# Altium footprint library Horizont_11_12_2017.PcbLib: 257 footprints (part 4 of 17)
Each footprint in its own frame and in the unit in brackets; x right, y up, seen from the top. Pads: shape width x height; smd on the part's side, far side on the other; paste and mask are expansions set on the pad; w line width, h text height; cw(c..) or ccw(c..) is an arc to the next point about the centre after c.
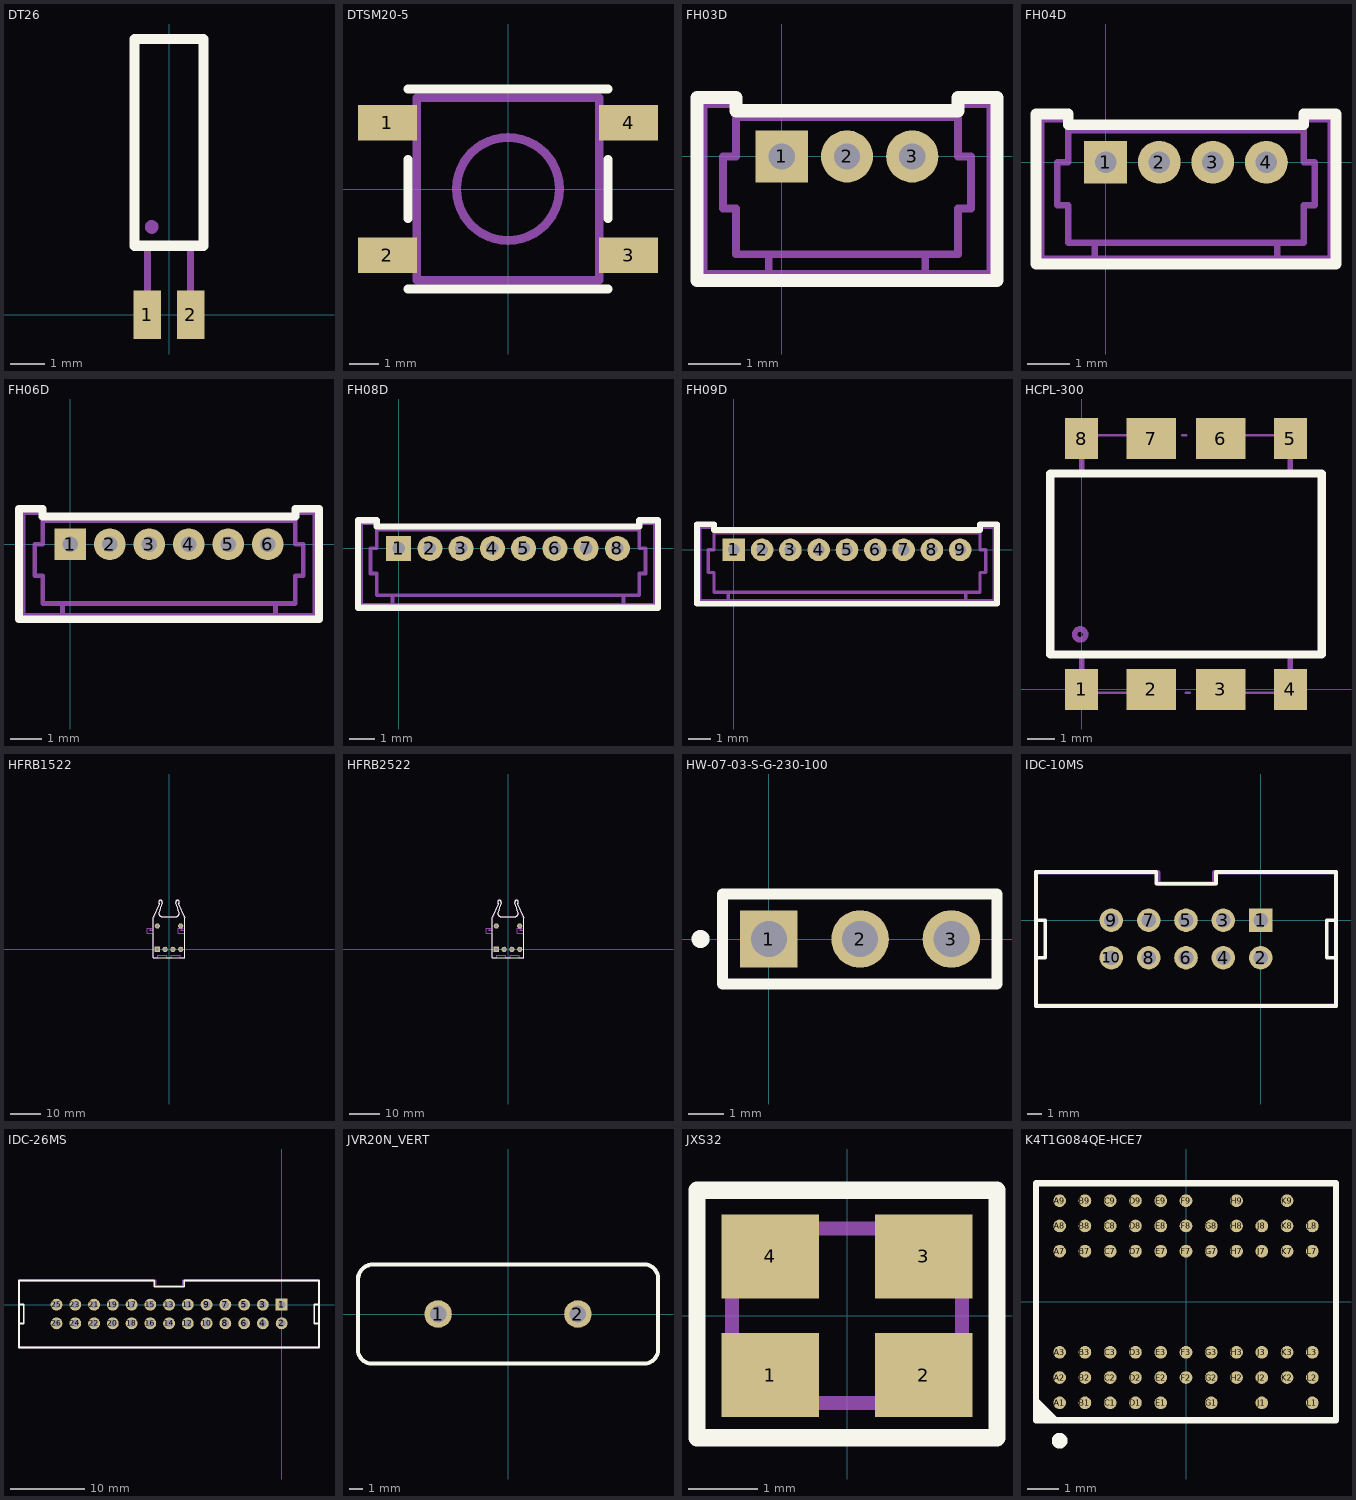
[diagram p3: the footprints below, top view; thin cyan lines are the x and y axes]

## DT26 [mm]
height 2
pads (2):
  rect 0.8x1.4 smd: 1(-0.625,0) 2(0.625,0)
Top Overlay:
  lines w0.3: -1,2 -1,8 1,8 1,2 -1,2
Mechanical 1:
  circle w0.2: c-0.5,2.55 r0.1
  lines w0.2: -0.625,-0.5 -0.625,2 ; 0.625,-0.5 0.625,2 ; -1,2 1,2 1,8 -1,8 -1,2
  text ".Designator" at 0.39,4 h1.5
3D body "pk-206.stp": height 2, standoff 0, extent -1,-0.5 0.992,8

## DTSM20-5 [mm]
height 5
pads (4):
  rect 2x1.2 smd: 1(-4.1,2.25) 2(-4.1,-2.25) 3(4.1,-2.25) 4(4.1,2.25)
Top Overlay:
  lines w0.3: -3.4,-3.4 3.4,-3.4 ; -3.4,-1 -3.4,1 ; -3.4,3.4 3.4,3.4 ; 3.4,-1 3.4,1
Mechanical 1:
  circle w0.3: c0,0 r1.75
  lines w0.3: -3.1,-2.6 -4.5,-2.6 -4.5,-1.9 -3.1,-1.9 ; -3.1,1.9 -4.5,1.9 -4.5,2.6 -3.1,2.6 ; 3.1,-2.6 4.5,-2.6 4.5,-1.9 3.1,-1.9 ; 3.1,1.9 4.5,1.9 4.5,2.6 3.1,2.6 ; -3.1,-3.1 -3.1,3.1 3.1,3.1 3.1,-3.1 -3.1,-3.1
  text ".Designator" at -2.24,3.83 h1.5
3D body "DTSM20-5.STEP": height 5.1, standoff 0, extent -4.5,-3.1 4.5,3.1

## FH03D [mm]
height 4.8
pads (3):
  rect 1x1 hole 0.5: 1(0,0)
  round 1 hole 0.5: 2(1.25,0) 3(2.5,0)
Top Overlay:
  lines w0.25: -1.625,-2.375 -1.625,1.125 -0.875,1.125 -0.875,0.875 3.375,0.875 3.375,1.125 4.125,1.125 4.125,-2.125 4.125,-2.375 -1.625,-2.375
Mechanical 1:
  lines w0.15: -0.25,-2.25 -0.25,-1.875 ; 2.625,-1.875 3.375,-1.875 ; 2.75,-2.25 2.75,-1.875 ; -0.875,0.75 -0.875,1 -1.5,1 -1.5,-2.25 4,-2.25 4,1 3.375,1 3.375,0.75 ; -0.875,0.75 -0.875,0 -1.125,0 -1.125,-1 -0.875,-1 -0.875,-1.875 3.375,-1.875 ; -0.875,0.75 3.375,0.75 ; 3.375,-1.875 3.375,-1 3.625,-1 3.625,0 3.375,0 3.375,0.75
  text "3" at 2.482,-0.482 h1.5
  text "1" at -0.268,-0.482 h1.5
  text ".Comment" at -0.3,-3.525 h1.5
  text ".Designator" at 0.15,-1.325 h1.5
3D body "FH03D.STEP": height 4.75, standoff -2.4, extent -1.5,-2.55 4,1.15

## FH04D [mm]
height 4.8
pads (4):
  rect 1x1 hole 0.5: 1(0,0)
  round 1 hole 0.5: 2(1.25,0) 3(2.5,0) 4(3.75,0)
Top Overlay:
  lines w0.25: -1.625,-2.375 -1.625,1.125 -0.875,1.125 -0.875,0.875 4.625,0.875 4.625,1.125 5.375,1.125 5.375,-2.125 5.375,-2.375 -1.625,-2.375
Mechanical 1:
  lines w0.15: -0.25,-2.25 -0.25,-1.875 ; 3.875,-1.875 4.625,-1.875 ; 4,-2.25 4,-1.875 ; -0.875,0.75 -0.875,1 -1.5,1 -1.5,-2.25 5.25,-2.25 5.25,1 4.625,1 4.625,0.75 ; -0.875,0.75 -0.875,0 -1.125,0 -1.125,-1 -0.875,-1 -0.875,-1.875 4.625,-1.875 ; -0.875,0.75 4.625,0.75 ; 4.625,-1.875 4.625,-1 4.875,-1 4.875,0 4.625,0 4.625,0.75
  text "4" at 3.732,-0.482 h1.5
  text "1" at -0.268,-0.482 h1.5
  text ".Comment" at -0.3,-3.525 h1.5
  text ".Designator" at 0.15,-1.325 h1.5
3D body "FH04D.STEP": height 4.75, standoff -2.4, extent -1.5,-2.55 5.25,1.15

## FH06D [mm]
height 4.8
pads (6):
  rect 1x1 hole 0.5: 1(0,0)
  round 1 hole 0.5: 2(1.25,0) 3(2.5,0) 4(3.75,0) 5(5,0) 6(6.25,0)
Top Overlay:
  lines w0.25: -1.625,-2.375 -1.625,1.125 -0.875,1.125 -0.875,0.875 7.125,0.875 7.125,1.125 7.875,1.125 7.875,-2.125 7.875,-2.375 -1.625,-2.375
Mechanical 1:
  lines w0.15: -0.25,-2.25 -0.25,-1.875 ; 6.5,-2.25 6.5,-1.875 ; -0.875,0.75 -0.875,1 -1.5,1 -1.5,-2.25 7.75,-2.25 7.75,1 7.125,1 7.125,0.75 ; -0.875,0.75 -0.875,0 -1.125,0 -1.125,-1 -0.875,-1 -0.875,-1.875 6.375,-1.875 7.125,-1.875 7.125,-1 7.375,-1 7.375,0 7.125,0 7.125,0.75 ; -0.875,0.75 7.125,0.75
  text "6" at 6.232,-0.482 h1.5
  text "1" at -0.268,-0.482 h1.5
  text ".Comment" at 0.925,-3.625 h1.5
  text ".Designator" at 1.525,-0.925 h1.5
3D body "FH06D.STEP": height 4.75, standoff -2.4, extent -1.5,-2.55 7.75,1.15

## FH08D [mm]
height 4.8
pads (8):
  rect 1x1 hole 0.5: 1(0,0)
  round 1 hole 0.5: 2(1.25,0) 3(2.5,0) 4(3.75,0) 5(5,0) 6(6.25,0) 7(7.5,0) 8(8.75,0)
Top Overlay:
  lines w0.25: -1.625,-2.375 10.375,-2.375 10.375,-2.125 10.375,1.125 9.625,1.125 9.625,0.875 -0.875,0.875 -0.875,1.125 -1.625,1.125 -1.625,-2.375
Mechanical 1:
  lines w0.15: -0.25,-2.25 -0.25,-1.875 ; 9,-2.25 9,-1.875 ; -0.875,0.75 9.625,0.75 ; -0.875,0.75 -0.875,0 -1.125,0 -1.125,-1 -0.875,-1 -0.875,-1.875 8.875,-1.875 9.625,-1.875 9.625,-1 9.875,-1 9.875,0 9.625,0 9.625,0.75 ; -0.875,0.75 -0.875,1 -1.5,1 -1.5,-2.25 10.25,-2.25 10.25,1 9.625,1 9.625,0.75
  text ".Designator" at 2.5,-1.25 h1.5
  text ".Comment" at 0.925,-3.625 h1.5
  text "1" at -0.268,-0.482 h1.5
  text "8" at 8.732,-0.482 h1.5
3D body "FH08D.STEP": height 4.75, standoff -2.4, extent -1.5,-2.55 10.25,1.15

## FH09D [mm]
height 4.8
pads (9):
  rect 1x1 hole 0.5: 1(0,0)
  round 1 hole 0.5: 2(1.25,0) 3(2.5,0) 4(3.75,0) 5(5,0) 6(6.25,0) 7(7.5,0) 8(8.75,0) 9(10,0)
Top Overlay:
  lines w0.25: -1.625,-2.375 11.625,-2.375 11.625,-2.125 11.625,1.125 10.875,1.125 10.875,0.875 -0.875,0.875 -0.875,1.125 -1.625,1.125 -1.625,-2.375
Mechanical 1:
  lines w0.15: -0.25,-2.25 -0.25,-1.875 ; 10.25,-2.25 10.25,-1.875 ; -0.875,0.75 10.875,0.75 ; -0.875,0.75 -0.875,0 -1.125,0 -1.125,-1 -0.875,-1 -0.875,-1.875 10.125,-1.875 10.875,-1.875 10.875,-1 11.125,-1 11.125,0 10.875,0 10.875,0.75 ; -0.875,0.75 -0.875,1 -1.5,1 -1.5,-2.25 11.5,-2.25 11.5,1 10.875,1 10.875,0.75
  text ".Designator" at 2.5,-1.25 h1.5
  text ".Comment" at 0.925,-3.625 h1.5
  text "1" at -0.268,-0.482 h1.5
  text "9" at 9.982,-0.482 h1.5
3D body "FH09D.STEP": height 4.75, standoff -2.4, extent -1.5,-2.55 11.5,1.15

## HCPL-300 [mm]
height 5
pads (8):
  rect 1.2x1.5 smd: 1(0,0) 4(7.62,0) 5(7.62,9.144) 8(0,9.144)
  rect 1.8x1.5 smd: 2(2.54,0) 3(5.08,0) 6(5.08,9.144) 7(2.54,9.144)
Top Overlay:
  lines w0.3: -1.14,1.272 -1.14,7.872 8.76,7.872 8.76,1.272 -1.14,1.272
Mechanical 1:
  circle w0.2: c-0.05,2.004 r0.2
  lines w0.1: 0,-0.127 3.175,-0.127 ; 0,9.271 3.175,9.271 ; 3.683,9.271 3.81,9.271 ; 3.81,-0.127 3.937,-0.127 ; 4.445,-0.127 7.62,-0.127 ; 4.445,9.271 7.62,9.271
  lines w0.2: 0,-0.127 0,1.27 ; 0,7.874 0,9.271 ; 7.62,-0.127 7.62,1.27 ; 7.62,7.874 7.62,9.271 ; -1.14,1.272 -1.14,7.872 8.76,7.872 8.76,1.272 -1.14,1.272
  text "8" at -0.27,6.555 h1.5
  text ".Comment" at 1.51,3.61 h1.5
  text ".Designator" at 3.1,5.31 h1.5
3D body "HCPL7800A-300.stp": height 4.96, standoff 0, extent -1.14,-0.38 8.76,9.52

## HFRB1522 [mm]
height 7.6
pads (6):
  rect 1.7x1.7 hole 1.1: 1(-3.81,0)
  round 1.7 hole 1.1: 2(-1.27,0) 3(1.27,0) 4(3.81,0) 5(3.81,7.62) 6(-3.81,7.62)
Top Overlay:
  circle w0.25: c-3.789,-0.002 r0.1
  lines w0.3: 3.1,14.8 5.1,10.3 5.1,9.8 5.1,-2.8 -5.1,-2.8 -5.1,10.3 -3.1,14.88 cw(c-2.8,15.4) -2.241,15.182 ccw(c22.449,5.555) -3.271,11.941 ccw(c-2.3,11.7) -2.3,10.7 2.3,10.7 ccw(c2.3,11.7) 3.271,11.941 ccw(c-22.449,5.555) 2.241,15.182 cw(c2.8,15.4) 3.1,14.88
Mechanical 1:
  lines w0.2: -7.1,5.2 -7.1,6.9 -5.6,6.9 -6.3,6.2 -5.1,6.2 -5.1,9.9 cw(c21.297,2.191) -3.1,14.88 cw(c-2.8,15.4) -2.241,15.182 ccw(c22.449,5.555) -3.271,11.941 ccw(c-2.3,11.7) -2.3,10.7 2.3,10.7 ccw(c2.3,11.7) 3.271,11.941 ccw(c-22.449,5.555) 2.241,15.182 cw(c2.8,15.4) 3.1,14.88 cw(c-21.297,2.191) 5.1,9.9 5.1,6.2 3.9,6.2 4.6,6.9 3.1,6.9 3.1,5.2 5.1,5.2 5.1,-2.8 3.6,-2.8 3.6,-2 0.75,-2 0.75,-2.8 -0.75,-2.8 -0.75,-2 -3.6,-2 -3.6,-2.8 -5.1,-2.8 -5.1,5.2 -7.1,5.2
  text ".Designator" at -3.082,3.588 h1.5
  text "2" at -1.482,-0.382 h1.5
  text "4" at 3.618,-0.382 h1.5
  text "1" at -3.982,-0.382 h1.5
  text "3" at 0.918,-0.382 h1.5
  text "6" at -4.082,8.388 h1.5
  text "5" at 3.618,8.388 h1.5
3D body "HFRB1522.stp": height 7.6, standoff -3.16, extent -7.1,-2.8 5.1,16

## HFRB2522 [mm]
height 7.6
pads (6):
  rect 1.7x1.7 hole 1.1: 1(-3.81,0)
  round 1.7 hole 1.1: 2(-1.27,0) 3(1.27,0) 4(3.81,0) 5(3.81,7.62) 6(-3.81,7.62)
Top Overlay:
  circle w0.25: c-3.789,-0.002 r0.1
  lines w0.3: 3.1,14.8 5.1,10.3 5.1,9.8 5.1,-2.8 -5.1,-2.8 -5.1,10.3 -3.1,14.88 cw(c-2.8,15.4) -2.241,15.182 ccw(c22.449,5.555) -3.271,11.941 ccw(c-2.3,11.7) -2.3,10.7 2.3,10.7 ccw(c2.3,11.7) 3.271,11.941 ccw(c-22.449,5.555) 2.241,15.182 cw(c2.8,15.4) 3.1,14.88
Mechanical 1:
  lines w0.2: -7.1,5.2 -7.1,6.9 -5.6,6.9 -6.3,6.2 -5.1,6.2 -5.1,9.9 cw(c21.297,2.191) -3.1,14.88 cw(c-2.8,15.4) -2.241,15.182 ccw(c22.449,5.555) -3.271,11.941 ccw(c-2.3,11.7) -2.3,10.7 2.3,10.7 ccw(c2.3,11.7) 3.271,11.941 ccw(c-22.449,5.555) 2.241,15.182 cw(c2.8,15.4) 3.1,14.88 cw(c-21.297,2.191) 5.1,9.9 5.1,6.2 3.9,6.2 4.6,6.9 3.1,6.9 3.1,5.2 5.1,5.2 5.1,-2.8 3.6,-2.8 3.6,-2 0.75,-2 0.75,-2.8 -0.75,-2.8 -0.75,-2 -3.6,-2 -3.6,-2.8 -5.1,-2.8 -5.1,5.2 -7.1,5.2
  text ".Designator" at -3.082,3.588 h1.5
  text "2" at -1.482,-0.382 h1.5
  text "4" at 3.618,-0.382 h1.5
  text "1" at -3.982,-0.382 h1.5
  text "3" at 0.918,-0.382 h1.5
  text "6" at -4.082,8.388 h1.5
  text "5" at 3.618,8.388 h1.5
3D body "HFRB1522.stp": height 7.6, standoff -3.16, extent -7.1,-2.8 5.1,16

## HW-07-03-S-G-230-100 [mm]
height 8.38
pads (3):
  rect 1.6x1.6 hole 1: 1(0,0)
  round 1.6 hole 1: 2(2.54,0) 3(5.08,0)
Top Overlay:
  circle w0.3: c-1.9,0 r0.1
  lines w0.3: -1.29,-1.25 6.35,-1.25 6.35,1.25 -1.29,1.25 -1.29,-1.25
Mechanical 1:
  lines w0.2: -1.29,-1.25 6.35,-1.25 6.35,1.25 -1.29,1.25 -1.29,-1.25
  text ".Designator" at 1.397,1.905 h1.5
  text "3" at 4.826,-0.381 h1.5
  text "1" at -0.254,-0.508 h1.5
3D body "HW-07-03-S-G-230-100.stp": height 8.38, standoff -2.54, extent -1.27,-1.27 6.35,1.27

## IDC-10MS [mm]
height 9.1
pads (10):
  rect 1.6x1.6 hole 1: 1(0,0)
  round 1.6 hole 1: 2(0,-2.54) 3(-2.54,0) 4(-2.54,-2.54) 5(-5.08,0) 6(-5.08,-2.54) 7(-7.62,0) 8(-7.62,-2.54) 9(-10.16,0) 10(-10.16,-2.54)
Top Overlay:
  lines w0.25: -7.102,3.22 -7.102,2.48 -3.038,2.48 -3.038,3.253 ; -7.102,3.28 -15.28,3.28 -15.28,-5.82 5.12,-5.82 5.12,3.28 -3.038,3.28
  lines w0.254: -15.28,-2.54 -14.645,-2.54 -14.645,0 -15.28,0 ; 5.12,-2.54 4.485,-2.54 4.485,0 5.12,0
Mechanical 1:
  lines w0.3: -3.165,3.253 -3.165,2.48 -6.975,2.48 -6.975,3.28 -15.28,3.28 -15.28,-5.82 5.12,-5.82 5.12,3.28 -3.165,3.28
  text "10" at -12.619,-2.947 h1.5
  text "2" at 1.477,-2.897 h1.5
  text "9" at -12.3,-0.42 h1.5
  text ".Designator" at -7.03,-1.42 h1.5
  text "1" at 1.477,-0.357 h1.5
3D body "BH-10.STEP": height 9.1, standoff -3, extent -15.33,-6.02 5.17,3.28

## IDC-26MS [mm]
height 9.1
pads (26):
  rect 1.6x1.6 hole 1: 1(0,0)
  round 1.6 hole 1: 2(0,-2.54) 3(-2.54,0) 4(-2.54,-2.54) 5(-5.08,0) 6(-5.08,-2.54) 7(-7.62,0) 8(-7.62,-2.54) 9(-10.16,0) 10(-10.16,-2.54) 11(-12.7,0) 12(-12.7,-2.54) 13(-15.24,0) 14(-15.24,-2.54) 15(-17.78,0) 16(-17.78,-2.54) 17(-20.32,0) 18(-20.32,-2.54) 19(-22.86,0) 20(-22.86,-2.54) 21(-25.4,0) 22(-25.4,-2.54) 23(-27.94,0) 24(-27.94,-2.54) 25(-30.48,0) 26(-30.48,-2.54)
Top Overlay:
  lines w0.25: -35.56,-5.82 5.06,-5.82 5.06,3.28 -13.188,3.28 -13.188,2.413 -17.252,2.413 -17.252,3.28 -35.56,3.28 -35.56,-5.82
  lines w0.254: -35.56,-2.54 -34.925,-2.54 -34.925,0 -35.56,0 ; 5.06,-2.54 4.425,-2.54 4.425,0 5.06,0
Mechanical 1:
  lines w0.3: -35.56,-5.82 5.06,-5.82 5.06,3.28 -13.315,3.28 -13.315,2.54 -17.125,2.54 -17.125,3.28 -35.56,3.28 -35.56,-5.82
  text ".Designator" at -17.907,-1.397 h1.5
  text "1" at 1.477,-0.357 h1.5
  text "25" at -33.209,-0.357 h1.5
  text "2" at 1.477,-2.897 h1.5
  text "26" at -33.209,-2.897 h1.5
3D body "BH-26.STEP": height 9.1, standoff -3, extent -35.65,-6.02 5.17,3.28

## JVR20N_VERT [mm]
height 28
pads (2):
  round 2 hole 1.2: 1(-5.08,0) 2(5.08,0)
Top Overlay:
  lines w0.3: -10,-3.6 10,-3.6 ; -9.9,-3.6 cw(c-9.9,-2.6) -10.9,-2.6 -10.9,2.5 cw(c-9.8,2.5) -9.8,3.6 10,3.6 ; 9.9,-3.6 ccw(c9.9,-2.6) 10.9,-2.6 10.9,2.6 ccw(c9.9,2.6) 9.9,3.6
Mechanical 1:
  circle w0.1: c-5.5,-0.05 r0.1
  lines w0.2: -10.9,-2.6 ccw(c-9.9,-2.6) -9.9,-3.6 ; -10.9,-2.5 -10.9,2.5 ; -10.9,2.6 cw(c-9.9,2.6) -9.9,3.6 ; -10.1,-3.6 9.9,-3.6 ccw(c9.9,-2.6) 10.9,-2.6 ; -10,3.6 10,3.6 ; 9.9,3.6 cw(c9.9,2.6) 10.9,2.6 ; 10.9,-2.5 10.9,2.5
  text ".Comment" at -2.5,-1.28 h1.5
  text ".Designator" at -0.91,0.42 h1.5
3D body "JVR-JOYIN.STEP": height 27.3, standoff -5.2, extent -10.9,-3.6 10.9,3.6

## JXS32 [mm]
height 0.7
pads (4):
  rect 1.4x1.2 smd: 1(-1.1,-0.85) 2(1.1,-0.85) 3(1.1,0.85) 4(-1.1,0.85)
Top Overlay:
  lines w0.25: -2.15,-1.75 2.15,-1.75 2.15,1.8 -2.15,1.8 -2.15,-1.75
Mechanical 1:
  lines w0.2: -1.65,-1.25 1.65,-1.25 1.65,1.25 -1.65,1.25 -1.65,-1.25
  text "3" at 0.8,0.1 h1.5
  text "4" at -1.35,0.1 h1.5
  text "2" at 0.75,-0.95 h1.5
  text "1" at -1.2,-1.05 h1.5
  text ".Designator" at -1.2,1.8 h1.5
3D body "JXS32.stp": height 0.7, standoff 0, extent -1.65,-1.3 1.65,1.3

## K4T1G084QE-HCE7 [mm]
height 1.2
pads (60):
  round 0.4 smd: A1(-4,-3.2) A2(-4,-2.4) A3(-4,-1.6) A7(-4,1.6) A8(-4,2.4) A9(-4,3.2) B1(-3.2,-3.2) B2(-3.2,-2.4) B3(-3.2,-1.6) B7(-3.2,1.6) B8(-3.2,2.4) B9(-3.2,3.2) C1(-2.4,-3.2) C2(-2.4,-2.4) C3(-2.4,-1.6) C7(-2.4,1.6) C8(-2.4,2.4) C9(-2.4,3.2) D1(-1.6,-3.2) D2(-1.6,-2.4) D3(-1.6,-1.6) D7(-1.6,1.6) D8(-1.6,2.4) D9(-1.6,3.2) E1(-0.8,-3.2) E2(-0.8,-2.4) E3(-0.8,-1.6) E7(-0.8,1.6) E8(-0.8,2.4) E9(-0.8,3.2) F2(0,-2.4) F3(0,-1.6) F7(0,1.6) F8(0,2.4) F9(0,3.2) G1(0.8,-3.2) G2(0.8,-2.4) G3(0.8,-1.6) G7(0.8,1.6) G8(0.8,2.4) H2(1.6,-2.4) H3(1.6,-1.6) H7(1.6,1.6) H8(1.6,2.4) H9(1.6,3.2) J1(2.4,-3.2) J2(2.4,-2.4) J3(2.4,-1.6) J7(2.4,1.6) J8(2.4,2.4) K2(3.2,-2.4) K3(3.2,-1.6) K7(3.2,1.6) K8(3.2,2.4) K9(3.2,3.2) L1(4,-3.2) L2(4,-2.4) L3(4,-1.6) L7(4,1.6) L8(4,2.4)
Top Overlay:
  circle w0.25: c-4,-4.4 r0.125
  region: -4.75,-3.132 -4.132,-3.75 -4.75,-3.75
  lines w0.2: -4.75,-3.132 -4.132,-3.75 ; -4.75,-3.75 -4.75,3.75 4.75,3.75 4.75,-3.75 -4.75,-3.75
Mechanical 1:
  lines w0.1: -4.75,-3.75 -4.75,3.75 4.75,3.75 4.75,-3.75 -4.75,-3.75
  text ".Designator" at -1.5,-0.4 h1.5
3D body: height 1.2, standoff 0.4, extent -4.75,-3.75 4.75,3.75